# Altium footprint library PCB.PcbLib: 72 footprints (part 1 of 5)
Each footprint in its own frame and in the unit in brackets; x right, y up, seen from the top. Pads: shape width x height; smd on the part's side, far side on the other; paste and mask are expansions set on the pad; w line width, h text height; cw(c..) or ccw(c..) is an arc to the next point about the centre after c.
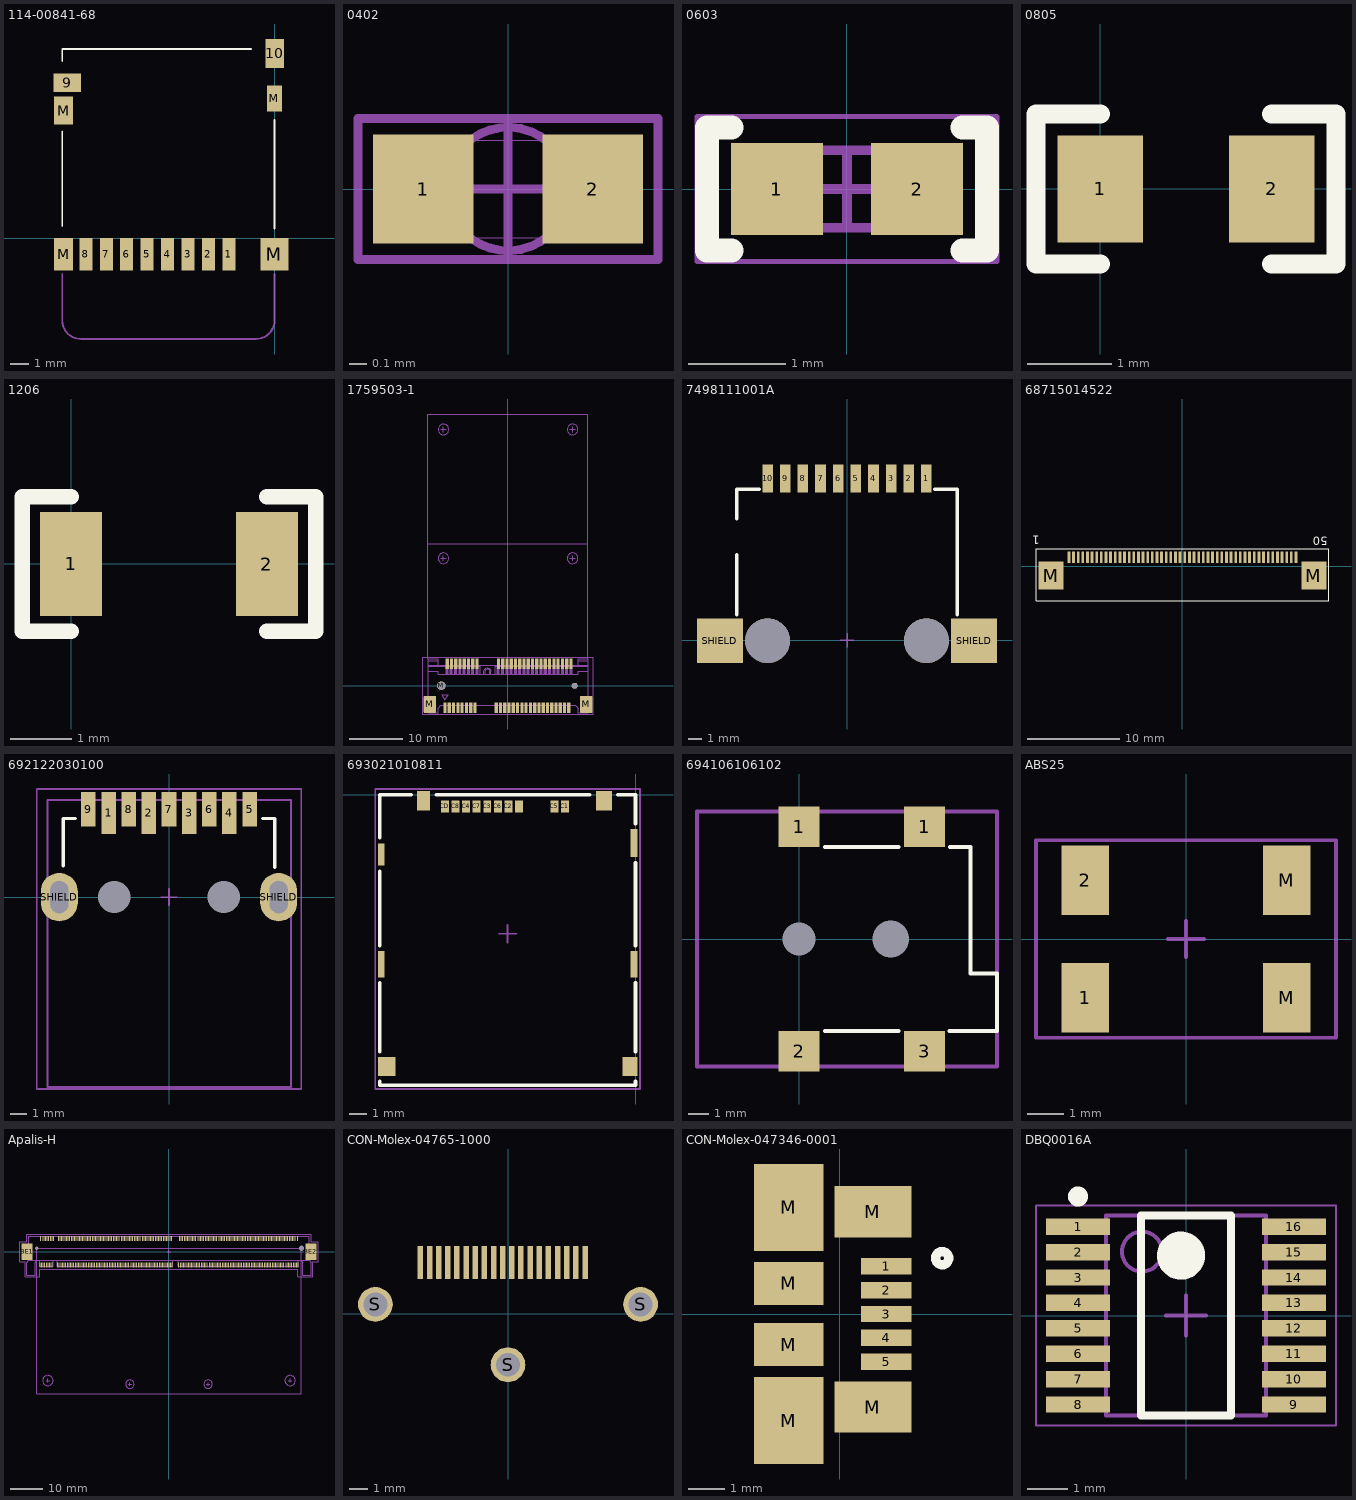
[diagram p0: the footprints below, top view; thin cyan lines are the x and y axes]

## 114-00841-68 [mm]
pads (14):
  rect 0.7x1.75 smd: 1(-2.455,-0.874) 2(-3.555,-0.874) 3(-4.655,-0.874) 4(-5.755,-0.874) 5(-6.855,-0.874) 6(-7.955,-0.874) 7(-9.055,-0.874) 8(-10.155,-0.874)
  rect 1.5x1 smd: 9(-11.155,8.365)
  rect 1x1.55 smd: 10(0.005,9.94)
  rect 1x1.75 smd: M(-11.355,-0.874)
  rect 1x1.5 smd: M(-11.355,6.865)
  rect 1.5x1.75 smd: M(-0.005,-0.874)
  rect 0.8x1.4 smd: M(-0.005,7.515)
Top Overlay:
  lines w0.1: -11.425,0.65 -11.425,5.73 ; -11.425,9.54 -11.425,10.175 -1.265,10.175 ; 0.005,0.523 0.005,6.365
Mechanical 15:
  lines w0.1: -11.425,-1.925 -11.425,-4.425 ccw(c-10.425,-4.425) -10.425,-5.425 -1,-5.425 ccw(c-1,-4.425) 0,-4.425 0,-1.925
  text "Micro SD Card" at -10.15,-4.075 h0.7
3D body: height 1.6, standoff 0, extent -11.628,-1.382 0.372,10.218

## 0402 [mm]
height 0.35
pads (2):
  rect 0.57x0.62 smd: 1(-0.48,0) 2(0.48,0)
Mechanical 3:
  circle w0.05: c0,0 r0.35
  lines w0.05: -0.5,0 0.5,0 ; 0,-0.4 0,0.4 ; -0.85,-0.4 0.85,-0.4 0.85,0.4 -0.85,0.4 -0.85,-0.4
Mechanical 13:
  lines w0.001: -0.525,-0.275 -0.525,0.275 0.525,0.275 0.525,-0.275 -0.525,-0.275
3D body: height 0.5, standoff 0, extent -0.55,-0.3 0.55,0.3

## 0603 [mm]
pads (2):
  rect 0.95x0.95 smd: 1(-0.725,0) 2(0.725,0)
Top Overlay:
  lines w0.25: -1.194,-0.635 -1.448,-0.635 -1.448,0.635 -1.194,0.635 ; 1.194,-0.635 1.448,-0.635 1.448,0.635 1.194,0.635
Mechanical 13:
  lines w0.1: -0.8,-0.4 -0.8,0.4 0.8,0.4 0.8,-0.4 -0.8,-0.4
Mechanical 15:
  lines w0.05: -1.55,-0.75 -1.55,0.75 1.55,0.75 1.55,-0.75 -1.55,-0.75
  lines w0.1: -0.4,0 0.4,0 ; 0,-0.4 0,0.4
3D body: height 0.46, standoff -0.01, extent -0.824,-0.412 0.825,0.413
3D body: height 0.45, standoff 0, extent -0.8,-0.4 -0.8,0.4
3D body: height 0.45, standoff 0, extent 0.8,-0.4 0.8,0.4

## 0805 [mil]
pads (2):
  rect 40x50 smd: 1(0,0) 2(80,0)
Top Overlay:
  lines w9: 0,-35 -30,-35 -30,35 0,35 ; 80,-35 110,-35 110,35 80,35
3D body: height 37.4, standoff 0, extent 0,-22.63 78.74,24.61

## 1206 [mm]
pads (2):
  rect 1.016x1.7 smd: 1(0,0) 2(3.2,0)
Top Overlay:
  lines w0.254: 0,-1.1 -0.8,-1.1 -0.8,1.1 0,1.1 ; 3.2,-1.1 4,-1.1 4,1.1 3.2,1.1
3D body: height 0.95, standoff -0.01, extent -0.477,-0.919 3.723,0.881

## 1759503-1 [mm]
pads (56):
  rrect12% 0.6x2 smd: 1(-11.8,-4.1) 2(-11.4,4.1) 3(-11,-4.1) 4(-10.6,4.1) 5(-10.2,-4.1) 6(-9.8,4.1) 7(-9.4,-4.1) 8(-9,4.1) 9(-8.6,-4.1) 10(-8.2,4.1) 11(-7.8,-4.1) 12(-7.4,4.1) 13(-7,-4.1) 14(-6.6,4.1) 15(-6.2,-4.1) 16(-5.8,4.1) 17(-2.2,-4.1) 18(-1.8,4.1) 19(-1.4,-4.1) 20(-1,4.1) 21(-0.6,-4.1) 22(-0.2,4.1) 23(0.2,-4.1) 24(0.6,4.1) 25(1,-4.1) 26(1.4,4.1) 27(1.8,-4.1) 28(2.2,4.1) 29(2.6,-4.1) 30(3,4.1) 31(3.4,-4.1) 32(3.8,4.1) 33(4.2,-4.1) 34(4.6,4.1) 35(5,-4.1) 36(5.4,4.1) 37(5.8,-4.1) 38(6.2,4.1) 39(6.6,-4.1) 40(7,4.1) 41(7.4,-4.1) 42(7.8,4.1) 43(8.2,-4.1) 44(8.6,4.1) 45(9,-4.1) 46(9.4,4.1) 47(9.8,-4.1) 48(10.2,4.1) 49(10.6,-4.1) 50(11,4.1) 51(11.4,-4.1) 52(11.8,4.1)
  rrect12% 2.3x3.2 smd: M(-14.65,-3.5) M(14.65,-3.5)
  round 1.6 hole 1.6 unplated mask-1: M(-12.5,0)
  round 1.1 hole 1.1 unplated mask-1: M(12.5,0)
Mechanical 13:
  drawing of 1754 lines, arcs and shapes, not listed
Mechanical 15:
  lines w0.1: -16,-5.3 16,-5.3 16,5.3 -16,5.3 -16,-2.1 -16,-5.3
Mechanical 16:
  circle w0.1: c-12.1,23.9 r1
  circle w0.1: c-12.1,48.05 r1
  circle w0.1: c12.1,48.05 r1
  circle w0.1: c12.1,23.9 r1
  lines w0.1: -15,5.025 -15,50.95 15,50.95 15,5 ; -15,26.65 15,26.65 ; -12.6,23.9 -11.6,23.9 ; -12.6,48.05 -11.6,48.05 ; -12.1,23.4 -12.1,24.4 ; -12.1,47.55 -12.1,48.55 ; 11.6,23.9 12.6,23.9 ; 11.6,48.05 12.6,48.05 ; 12.1,23.4 12.1,24.4 ; 12.1,47.55 12.1,48.55
Mechanical 17:
  text "Half Card Size" at -4.55,25.15 h0.76
  text "Full Card Size" at -5.25,49.775 h0.76
3D body: height 8.05, standoff -0.89, extent -15,-5 15,4.733

## 7498111001A [mm] "LAN Transformer, body 21.6x15.88mm"
height 13.5
pads (14):
  rect 0.76x2.03 smd: 1(5.715,11.64) 2(4.445,11.64) 3(3.175,11.64) 4(1.905,11.64) 5(0.635,11.64) 6(-0.635,11.64) 7(-1.905,11.64) 8(-3.175,11.64) 9(-4.445,11.64) 10(-5.715,11.64)
  rect 3.3x3.18 smd: SHIELD(-9.145,-0.04) SHIELD(9.145,-0.04)
  round 3.22 hole 3.22 unplated: ""(-5.715,-0.04) ""(5.715,-0.04)
Top Overlay:
  lines w0.254: -7.94,1.84 -7.94,6.15 ; -7.94,8.735 -7.94,10.85 -6.33,10.85 ; 6.33,10.85 7.94,10.85 7.94,1.84
Mechanical 15:
  lines w0.1: -0.5,0 0.5,0 ; 0,-0.5 0,0.5
3D body: height 13.6, standoff -2.62, extent -10.25,-10.74 10.25,11.86

## 68715014522 [mm] "50 pins"
height 2.1
pads (52):
  rect 0.3x1.2 smd: 1(-12.25,0.99) 2(-11.75,0.99) 3(-11.25,0.99) 4(-10.75,0.99) 5(-10.25,0.99) 6(-9.75,0.99) 7(-9.25,0.99) 8(-8.75,0.99) 9(-8.25,0.99) 10(-7.75,0.99) 11(-7.25,0.99) 12(-6.75,0.99) 13(-6.25,0.99) 14(-5.75,0.99) 15(-5.25,0.99) 16(-4.75,0.99) 17(-4.25,0.99) 18(-3.75,0.99) 19(-3.25,0.99) 20(-2.75,0.99) 21(-2.25,0.99) 22(-1.75,0.99) 23(-1.25,0.99) 24(-0.75,0.99) 25(-0.25,0.99) 26(0.25,0.99) 27(0.75,0.99) 28(1.25,0.99) 29(1.75,0.99) 30(2.25,0.99) 31(2.75,0.99) 32(3.25,0.99) 33(3.75,0.99) 34(4.25,0.99) 35(4.75,0.99) 36(5.25,0.99) 37(5.75,0.99) 38(6.25,0.99) 39(6.75,0.99) 40(7.25,0.99) 41(7.75,0.99) 42(8.25,0.99) 43(8.75,0.99) 44(9.25,0.99) 45(9.75,0.99) 46(10.25,0.99) 47(10.75,0.99) 48(11.25,0.99) 49(11.75,0.99) 50(12.25,0.99)
  rect 2.7x3 smd: M(-14.18,-0.99) M(14.18,-0.99)
Top Overlay:
  lines w0.127: -15.8,-3.71 -15.8,1.89 15.8,1.89 15.8,-3.71 -15.8,-3.71
  text "1" at -15.38,3.332 h0.9
  text "50" at 15.67,3.18 h0.9
3D body: height 2.06, standoff -0.04, extent -15.7,-3.71 15.7,1.39

## 692122030100 [mm] "Receptacle Dual port TH"
height 6.99
pads (13):
  rect 0.9x2.6 smd: 1(-3.75,5.22) 2(-1.25,5.22) 3(1.25,5.22) 4(3.75,5.22)
  rect 0.9x2.15 smd: 5(5,5.445) 6(2.5,5.445) 7(0,5.445) 8(-2.5,5.445) 9(-5,5.445)
  oval 2.3x3 hole 1.12 slot 2 at 90 deg: SHIELD(-6.8,0) SHIELD(6.8,0)
  round 1.8 hole 2 unplated: ""(-3.4,0) ""(3.4,0)
Top Overlay:
  lines w0.2: -6.55,1.932 -6.55,4.873 -5.8,4.873 ; 5.8,4.873 6.55,4.873 6.55,1.833
Mechanical 13:
  lines w0.127: -7.546,-11.78 -7.546,6.02 7.554,6.02 7.554,-11.774 7.55,-11.777 -7.544,-11.777 -7.546,-11.78
Mechanical 15:
  lines w0.1: -0.5,0 0.5,0 ; 0,-0.5 0,0.5 ; -8.2,-11.9 -8.2,0 -8.2,6.7 8.2,6.7 8.2,-11.9 -8.2,-11.9
3D body: height 7.98, standoff -2.26, extent -7.546,-11.78 7.554,6.02

## 693021010811 [mm] "Micro SIM Push & Push Type SMT - with Card Detection - 1.25mm Height"
height 1.25
pads (18):
  rect 0.45x0.68 smd: C1(-4,-0.66) C2(-7.2,-0.66) C3(-8.4,-0.66) C4(-9.6,-0.66) C5(-4.6,-0.66) C6(-7.8,-0.66) C7(-9,-0.66) C8(-10.2,-0.66) CD(-10.8,-0.66) COM(-6.6,-0.66)
  rect 0.37x1.5 smd: SHIELD(-14.415,-9.6) SHIELD(-0.085,-9.6)
  rect 0.37x1.25 smd: SHIELD(-14.415,-3.375)
  rect 1x1.1 smd: SHIELD(-14.1,-15.4)
  rect 0.75x1.1 smd: SHIELD(-12.02,-0.35)
  rect 0.9x1.1 smd: SHIELD(-1.79,-0.35)
  rect 0.85x1.1 smd: SHIELD(-0.325,-15.4)
  rect 0.37x1.6 smd: SHIELD(-0.085,-2.74)
Top Overlay:
  lines w0.2: -14.5,-16.25 -14.5,-16.45 0,-16.45 0,-16.25 ; -14.5,-14.55 -14.5,-10.65 ; -14.5,-8.55 -14.5,-4.35 ; -14.5,-2.425 -14.5,0 -12.7,0 ; -11.3,0 -2.6,0 ; -1,0 0,0 0,-1.65 ; 0,-14.55 0,-10.65 ; 0,-8.55 0,-3.85
Mechanical 15:
  lines w0.1: -7.75,-7.875 -6.75,-7.875 ; -7.25,-8.375 -7.25,-7.375 ; -14.75,-16.675 0.25,-16.675 0.25,0.325 -12.05,0.325 -14.75,0.325 -14.75,-16.675
3D body: height 1.33, standoff -0.01, extent -14.5,-16.584 0,0

## 694106106102 [mm] "WR-DC_DC Power Jack_Right Angled_SMT Center Pin ?2.0_Plug ID ?2.05_Plug OD ?5.5_with 4 Soldering Pag & Peg"
height 11
pads (6):
  rect 2x2 smd: 1(0,5.5) 1(6.15,5.5) 2(0,-5.5) 3(6.15,-5.5)
  round 1.4 hole 1.6 unplated: ""(0,0)
  round 1.6 hole 1.8 unplated: ""(4.5,0)
Top Overlay:
  lines w0.2: 1.27,-4.5 4.88,-4.5 ; 1.27,4.5 4.88,4.5 ; 7.366,-4.5 9.7,-4.5 9.7,-1.7 8.4,-1.7 8.4,4.5 7.4,4.5
Mechanical 13:
  lines w0.2: -5,-6.248 9.7,-6.248 9.7,6.252 -5,6.252 -5,-6.248
3D body: height 11.05, standoff -1.15, extent -5,-6.248 9.7,6.252

## ABS25 [mm]
pads (4):
  rect 1.3x1.9 smd: 1(-2.75,-1.6) 2(-2.75,1.6) M(2.75,-1.6) M(2.75,1.6)
Mechanical 15:
  lines w0.1: -0.5,0 0.5,0 ; 0,-0.5 0,0.5 ; -4.1,-2.7 4.1,-2.7 4.1,2.7 -4.1,2.7 -4.1,-2.7
3D body: height 2.7, standoff -0.01, extent -4,-2 4,2

## Apalis-H [mm]
height 6.7
pads (314):
  rect 0.3x1.5 smd: 1(-40,-4.1) 2(-39.75,4.1) 3(-39.5,-4.1) 4(-39.25,4.1) 5(-39,-4.1) 6(-38.75,4.1) 7(-38.5,-4.1) 8(-38.25,4.1) 9(-38,-4.1) 10(-37.75,4.1) 11(-37.5,-4.1) 12(-37.25,4.1) 13(-37,-4.1) 14(-36.75,4.1) 15(-36.5,-4.1) 16(-36.25,4.1) 17(-36,-4.1) 18(-35.75,4.1) 23(-34.5,-4.1) 24(-34.25,4.1) 25(-34,-4.1) 26(-33.75,4.1) 27(-33.5,-4.1) 28(-33.25,4.1) 29(-33,-4.1) 30(-32.75,4.1) 31(-32.5,-4.1) 32(-32.25,4.1) 33(-32,-4.1) 34(-31.75,4.1) 35(-31.5,-4.1) 36(-31.25,4.1) 37(-31,-4.1) 38(-30.75,4.1) 39(-30.5,-4.1) 40(-30.25,4.1) 41(-30,-4.1) 42(-29.75,4.1) 43(-29.5,-4.1) 44(-29.25,4.1) 45(-29,-4.1) 46(-28.75,4.1) 47(-28.5,-4.1) 48(-28.25,4.1) 49(-28,-4.1) 50(-27.75,4.1) 51(-27.5,-4.1) 52(-27.25,4.1) 53(-27,-4.1) 54(-26.75,4.1) 55(-26.5,-4.1) 56(-26.25,4.1) 57(-26,-4.1) 58(-25.75,4.1) 59(-25.5,-4.1) 60(-25.25,4.1) 61(-25,-4.1) 62(-24.75,4.1) 63(-24.5,-4.1) 64(-24.25,4.1) 65(-24,-4.1) 66(-23.75,4.1) 67(-23.5,-4.1) 68(-23.25,4.1) 69(-23,-4.1) 70(-22.75,4.1) 71(-22.5,-4.1) 72(-22.25,4.1) 73(-22,-4.1) 74(-21.75,4.1) 75(-21.5,-4.1) 76(-21.25,4.1) 77(-21,-4.1) 78(-20.75,4.1) 79(-20.5,-4.1) 80(-20.25,4.1) 81(-20,-4.1) 82(-19.75,4.1) 83(-19.5,-4.1) 84(-19.25,4.1) 85(-19,-4.1) 86(-18.75,4.1) 87(-18.5,-4.1) 88(-18.25,4.1) 89(-18,-4.1) 90(-17.75,4.1) 91(-17.5,-4.1) 92(-17.25,4.1) 93(-17,-4.1) 94(-16.75,4.1) 95(-16.5,-4.1) 96(-16.25,4.1) 97(-16,-4.1) 98(-15.75,4.1) 99(-15.5,-4.1) 100(-15.25,4.1) 101(-15,-4.1) 102(-14.75,4.1) 103(-14.5,-4.1) 104(-14.25,4.1) 105(-14,-4.1) 106(-13.75,4.1) 107(-13.5,-4.1) 108(-13.25,4.1) 109(-13,-4.1) 110(-12.75,4.1) 111(-12.5,-4.1) 112(-12.25,4.1) 113(-12,-4.1) 114(-11.75,4.1) 115(-11.5,-4.1) 116(-11.25,4.1) 117(-11,-4.1) 118(-10.75,4.1) 119(-10.5,-4.1) 120(-10.25,4.1) 121(-10,-4.1) 122(-9.75,4.1) 123(-9.5,-4.1) 124(-9.25,4.1) 125(-9,-4.1) 126(-8.75,4.1) 127(-8.5,-4.1) 128(-8.25,4.1) 129(-8,-4.1) 130(-7.75,4.1) 131(-7.5,-4.1) 132(-7.25,4.1) 133(-7,-4.1) 134(-6.75,4.1) 135(-6.5,-4.1) 136(-6.25,4.1) 137(-6,-4.1) 138(-5.75,4.1) 139(-5.5,-4.1) 140(-5.25,4.1) 141(-5,-4.1) 142(-4.75,4.1) 143(-4.5,-4.1) 144(-4.25,4.1) 145(-4,-4.1) 146(-3.75,4.1) 147(-3.5,-4.1) 148(-3.25,4.1) 149(-3,-4.1) 150(-2.75,4.1) 151(-2.5,-4.1) 152(-2.25,4.1) 153(-2,-4.1) 154(-1.75,4.1) 155(-1.5,-4.1) 156(-1.25,4.1) 157(-1,-4.1) 158(-0.75,4.1) 159(-0.5,-4.1) 160(-0.25,4.1) 161(0,-4.1) 162(0.25,4.1) 163(0.5,-4.1) 164(0.75,4.1) 165(1,-4.1) 173(3,-4.1) 174(3.25,4.1) 175(3.5,-4.1) 176(3.75,4.1) 177(4,-4.1) 178(4.25,4.1) 179(4.5,-4.1) 180(4.75,4.1) 181(5,-4.1) 182(5.25,4.1) 183(5.5,-4.1) 184(5.75,4.1) 185(6,-4.1) 186(6.25,4.1) 187(6.5,-4.1) 188(6.75,4.1) 189(7,-4.1) 190(7.25,4.1) 191(7.5,-4.1) 192(7.75,4.1) 193(8,-4.1) 194(8.25,4.1) 195(8.5,-4.1) 196(8.75,4.1) 197(9,-4.1) 198(9.25,4.1) 199(9.5,-4.1) 200(9.75,4.1) 201(10,-4.1) 202(10.25,4.1) 203(10.5,-4.1) 204(10.75,4.1) 205(11,-4.1) 206(11.25,4.1) 207(11.5,-4.1) 208(11.75,4.1) 209(12,-4.1) 210(12.25,4.1) 211(12.5,-4.1) 212(12.75,4.1) 213(13,-4.1) 214(13.25,4.1) 215(13.5,-4.1) 216(13.75,4.1) 217(14,-4.1) 218(14.25,4.1) 219(14.5,-4.1) 220(14.75,4.1) 221(15,-4.1) 222(15.25,4.1) 223(15.5,-4.1) 224(15.75,4.1) 225(16,-4.1) 226(16.25,4.1) 227(16.5,-4.1) 228(16.75,4.1) 229(17,-4.1) 230(17.25,4.1) 231(17.5,-4.1) 232(17.75,4.1) 233(18,-4.1) 234(18.25,4.1) 235(18.5,-4.1) 236(18.75,4.1) 237(19,-4.1) 238(19.25,4.1) 239(19.5,-4.1) 240(19.75,4.1) 241(20,-4.1) 242(20.25,4.1) 243(20.5,-4.1) 244(20.75,4.1) 245(21,-4.1) 246(21.25,4.1) 247(21.5,-4.1) 248(21.75,4.1) 249(22,-4.1) 250(22.25,4.1) 251(22.5,-4.1) 252(22.75,4.1) 253(23,-4.1) 254(23.25,4.1) 255(23.5,-4.1) 256(23.75,4.1) 257(24,-4.1) 258(24.25,4.1) 259(24.5,-4.1) 260(24.75,4.1) 261(25,-4.1) 262(25.25,4.1) 263(25.5,-4.1) 264(25.75,4.1) 265(26,-4.1) 266(26.25,4.1) 267(26.5,-4.1) 268(26.75,4.1) 269(27,-4.1) 270(27.25,4.1) 271(27.5,-4.1) 272(27.75,4.1) 273(28,-4.1) 274(28.25,4.1) 275(28.5,-4.1) 276(28.75,4.1) 277(29,-4.1) 278(29.25,4.1) 279(29.5,-4.1) 280(29.75,4.1) 281(30,-4.1) 282(30.25,4.1) 283(30.5,-4.1) 284(30.75,4.1) 285(31,-4.1) 286(31.25,4.1) 287(31.5,-4.1) 288(31.75,4.1) 289(32,-4.1) 290(32.25,4.1) 291(32.5,-4.1) 292(32.75,4.1) 293(33,-4.1) 294(33.25,4.1) 295(33.5,-4.1) 296(33.75,4.1) 297(34,-4.1) 298(34.25,4.1) 299(34.5,-4.1) 300(34.75,4.1) 301(35,-4.1) 302(35.25,4.1) 303(35.5,-4.1) 304(35.75,4.1) 305(36,-4.1) 306(36.25,4.1) 307(36.5,-4.1) 308(36.75,4.1) 309(37,-4.1) 310(37.25,4.1) 311(37.5,-4.1) 312(37.75,4.1) 313(38,-4.1) 314(38.25,4.1) 315(38.5,-4.1) 316(38.75,4.1) 317(39,-4.1) 318(39.25,4.1) 319(39.5,-4.1) 320(39.75,4.1) 321(40,-4.1)
  rect 3.3x5 smd: BE1(-43.95,0) BE2(43.95,0)
  round 0.5 hole 1.1 unplated paste-1 mask-1: ""(-41,1.1)
  round 0.5 hole 1.6 unplated paste-1 mask-1: ""(41,1.1)
Mechanical 13:
  lines w0.1: -40.9,-2.65 -41.4,-3.35 -41.4,-7.35 -44,-7.35 -44,-3.35 -43.5,-2.65 ; -40.1,-2.65 -40.1,-4.45 -35.9,-4.45 -35.9,-2.65 ; -34.6,-2.65 -34.6,-4.45 1.1,-4.45 1.1,-2.65 ; 2.9,-2.65 2.9,-4.45 40.1,-4.45 40.1,-2.65 ; 40.9,-2.65 41.4,-3.35 41.4,-7.35 44,-7.35 44,-3.35 43.5,-2.65 ; -43.5,-2.65 43.5,-2.65 ; -43.5,-2.65 -43.5,-2 -44.95,-2 -44.95,2 -43.5,2 -43.5,4.85 43.5,4.85 43.5,2 44.95,2 44.95,-2 43.5,-2 43.5,-2.65
Mechanical 15:
  lines w0.05: 39.92,-7.82 39.92,-5.46 -39.95,-5.46 -39.95,-7.82 -44.5,-7.82 -44.5,-3.17 -46.24,-3.17 -46.24,3.17 -43.99,3.17 -43.99,5.34 44.04,5.34 44.04,3.16 46.24,3.16 46.24,-3.17 44.5,-3.17 44.5,-7.82 39.95,-7.82
  lines w0.1: -0.5,0 0.5,0 ; 0,-0.5 0,0.5
Mechanical 16:
  circle w0.1: c-12.1,-41 r1.3
  circle w0.1: c12.1,-41 r1.3
  circle w0.1: c37.5,-39.9 r1.6
  circle w0.1: c-37.5,-39.9 r1.6
  lines w0.1: -38,-39.9 -37,-39.9 ; -37.5,-40.4 -37.5,-39.4 ; -12.6,-41 -11.6,-41 ; -12.1,-41.5 -12.1,-40.5 ; 11.6,-41 12.6,-41 ; 12.1,-41.5 12.1,-40.5 ; 37,-39.9 38,-39.9 ; 37.5,-40.4 37.5,-39.4 ; -41,-43.9 41,-43.9 41,1.1 -41,1.1 -41,-43.9
3D body: height 6.72, standoff -0.98, extent -44.95,-7.35 44.95,4.85

## CON-Molex-04765-1000 [mm]
pads (22):
  rect 0.3x1.8 smd: 1(4.21,2.8) 2(3.71,2.8) 3(3.21,2.8) 4(2.71,2.8) 5(2.21,2.8) 6(1.71,2.8) 7(1.21,2.8) 8(0.71,2.8) 9(0.21,2.8) 10(-0.29,2.8) 11(-0.79,2.8) 12(-1.29,2.8) 13(-1.79,2.8) 14(-2.29,2.8) 15(-2.79,2.8) 16(-3.29,2.8) 17(-3.79,2.8) 18(-4.29,2.8) 19(-4.79,2.8)
  round 1.9 hole 1.3: S(-7.25,0.5) S(0,-2.8) S(7.25,0.5)
3D body: height 9.56, standoff -3.18, extent -8.75,-4.464 8.75,3.488

## CON-Molex-047346-0001 [mm]
pads (11):
  rect 1.38x0.45 smd: 1(1.263,1.3) 2(1.263,0.65) 3(1.263,0) 4(1.263,-0.65) 5(1.263,-1.3)
  rect 1.9x2.37 smd: M(-1.397,-2.91) M(-1.397,2.91)
  rect 1.9x1.175 smd: M(-1.397,-0.837) M(-1.397,0.837)
  rect 2.1x1.4 smd: M(0.903,-2.54) M(0.903,2.794)
Top Overlay:
  circle w0.254: c2.794,1.524 r0.18
3D body: height 2.71, standoff -0.23, extent -3.796,-3.99 1.634,3.99

## DBQ0016A [mm]
height 1.75
pads (16):
  rect 1.6x0.41 smd: 1(-2.7,2.222) 2(-2.7,1.587) 3(-2.7,0.953) 4(-2.7,0.318) 5(-2.7,-0.318) 6(-2.7,-0.953) 7(-2.7,-1.587) 8(-2.7,-2.222) 9(2.7,-2.222) 10(2.7,-1.587) 11(2.7,-0.953) 12(2.7,-0.318) 13(2.7,0.318) 14(2.7,0.953) 15(2.7,1.587) 16(2.7,2.222)
Top Overlay:
  circle w0.25: c-2.7,2.977 r0.125
  circle w0.6: c-0.125,1.5 r0.3
  lines w0.2: -1.125,-2.5 -1.125,2.5 1.125,2.5 1.125,-2.5 -1.125,-2.5
Mechanical 13:
  circle w0.1: c-1.1,1.6 r0.5
  lines w0.1: -2,-2.5 -2,2.5 2,2.5 2,-2.5 -2,-2.5
Mechanical 15:
  lines w0.05: -3.75,-2.75 -3.75,2.75 3.75,2.75 3.75,-2.75 -3.75,-2.75
  lines w0.1: -0.5,0 0.5,0 ; 0,-0.5 0,0.5
3D body: height 1.75, standoff 0.1, extent -2,-2.5 2,2.5